# Altium footprint library AltiumDesignerLibraries.PcbLib: 313 footprints (part 1 of 20)
Each footprint in its own frame and in the unit in brackets; x right, y up, seen from the top. Pads: shape width x height; smd on the part's side, far side on the other; paste and mask are expansions set on the pad; w line width, h text height; cw(c..) or ccw(c..) is an arc to the next point about the centre after c.
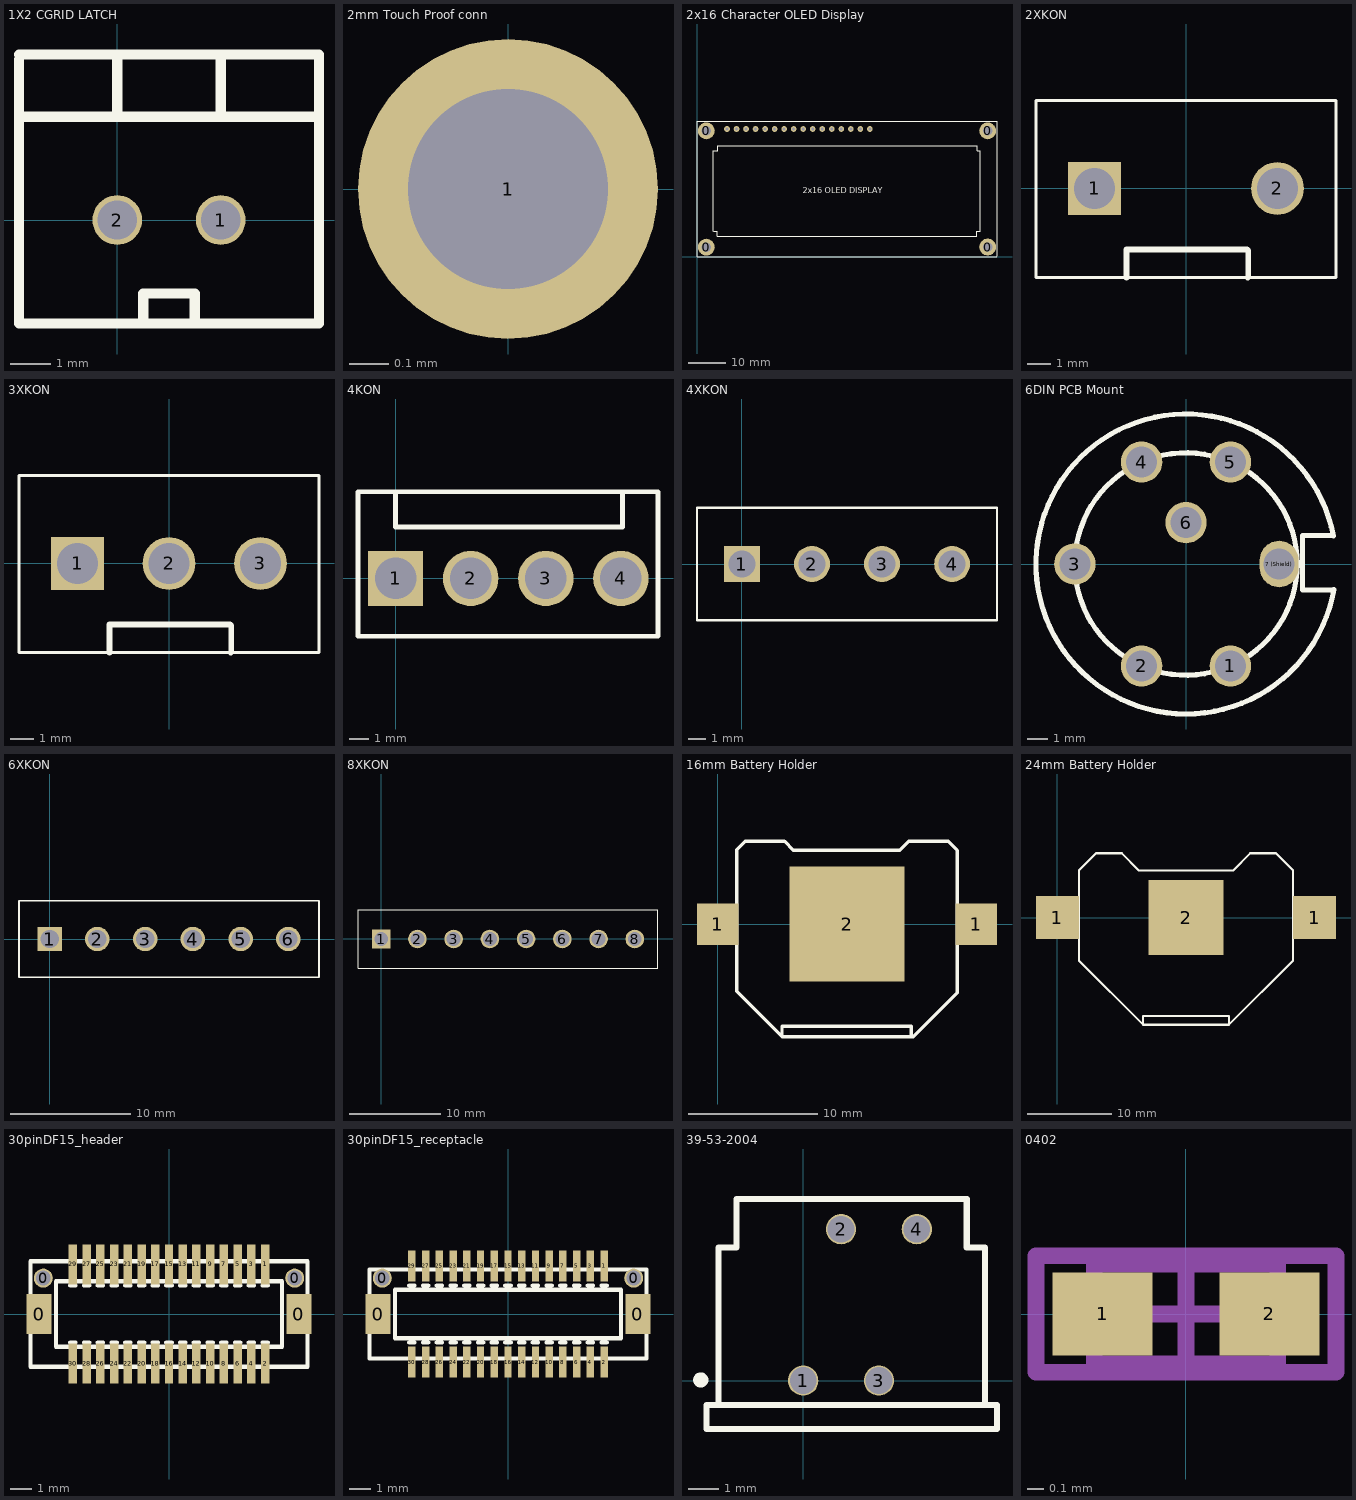
[diagram p0: the footprints below, top view; thin cyan lines are the x and y axes]

## 1X2 CGRID LATCH [mil]
pads (2):
  round 48 hole 38 unplated: 1(100,0) 2(0,0)
Top Overlay:
  lines w10: -95,155 -95,100 -95,-100 195,-100 195,100 ; -95,160 0,160 ; -93,100 195,100 ; 0,100 0,160 ; 25,-100 25,-71 75,-71 75,-100 ; 100,100 100,160 ; 0,160 100,160 ; 100,160 195,160 195,100

## 2mm Touch Proof conn [mil] "2mm Touch Proof conn"
pads (1):
  round 30 hole 20: 1(0,0)

## 2x16 Character OLED Display [mm]
pads (20):
  round 4.5 hole 2.5: 0(2.5,2.5) 0(2.5,33.5) 0(77.5,2.53) 0(77.5,33.5)
  round 1.524 hole 0.762: 1(8,34) 2(10.54,34) 3(13.08,34) 4(15.62,34) 5(18.16,34) 6(20.7,34) 7(23.24,34) 8(25.78,34) 9(28.32,34) 10(30.86,34) 11(33.4,34) 12(35.94,34) 13(38.48,34) 14(41.02,34) 15(43.56,34) 16(46.1,34)
Top Overlay:
  lines w0.254: 4.4,6.67 4.4,28.185 ; 4.409,28.185 5.47,28.185 5.47,29.6 74.685,29.6 74.685,28.185 75.591,28.185 ; 4.461,6.67 5.4,6.67 5.4,5.4 74.615,5.4 74.615,6.67 75.6,6.67 75.6,28.185 ; 79.99,0 0,0 0,36 80,36 80,0.01
  text "2x16 OLED DISPLAY" at 28.194,16.891 h1.52
3D body: height 13.8, standoff 7.4, extent -0.082,-0.001 79.918,35.999
3D body: height 9.56, standoff -3.38, extent 37.21,32.73 47.37,35.27
3D body: height 9.56, standoff -3.38, extent 27.05,32.73 37.21,35.27
3D body: height 9.56, standoff -3.38, extent 16.89,32.73 27.05,35.27
3D body: height 9.56, standoff -3.38, extent 6.73,32.73 16.89,35.27

## 2XKON [mil] "Pins spaced for AC mains connection"
pads (2):
  rect 90x90 hole 70: 1(-156,0)
  round 90 hole 70: 2(156,0)
Top Overlay:
  lines w5: -256,-152 256,-152 256,150 -256,150 -256,-152
  lines w10: -101.38,-152 -101.38,-104.33 104.33,-104.33 106.3,-106.3 106.3,-151.02 105.31,-152

## 3XKON [mil] "0.156\" pin spacing"
pads (3):
  rect 90x90 hole 70: 1(-156,0)
  round 90 hole 70: 2(0,0) 3(156,0)
Top Overlay:
  lines w5: -256,-152 -256,150 256,150 256,-152 -256,-152
  lines w10: -101.38,-152 -101.38,-104.33 104.33,-104.33 106.3,-106.3 106.3,-151.02 105.31,-152

## 4KON [mil]
pads (4):
  rect 115x115 hole 86: 1(0,0)
  round 115 hole 86: 2(156,0) 3(312,0) 4(468,0)
Top Overlay:
  lines w10: 0,107 312,107 ; 0,108 0,180 ; 310,107 471,107 ; 471,110 471,180 ; -78,-120 545,-120 545,180 156,180 -78,180 -78,-120

## 4XKON [mil]
pads (4):
  rect 80x80 hole 60: 1(0.25,0)
  round 80 hole 60: 2(156.25,0) 3(312.25,0) 4(468.25,0)
Top Overlay:
  lines w5: -99.75,-125 568.25,-125 568.25,125 -99.75,125 -99.75,-125

## 6DIN PCB Mount [mil]
pads (7):
  round 80 hole 60: 1(85.73,-197.17) 2(-85.73,-197.17) 3(-215,0) 4(-85.73,197.17) 5(85.73,197.17) 6(0,80)
  oval 75x90 hole 60: "7 (Shield)"(180,0)
Top Overlay:
  circle w10: c0,0 r215
  lines w10: 284.92,54.04 ccw(c0,0) 285.78,-49.27 ; 285,-50 225,-50 225,55 285,55

## 6XKON [mil]
pads (6):
  rect 80x80 hole 60: 1(0.25,0)
  round 80 hole 60: 2(156.25,0) 3(312.25,0) 4(468.25,0) 5(624.25,0) 6(780.25,0)
Top Overlay:
  lines w5: -99.75,-125 -99.75,125 880.25,125 880.25,-125 -99.75,-125

## 8XKON [mil]
pads (8):
  rect 80x80 hole 60: 1(0,-0.25)
  round 80 hole 60: 2(156,-0.25) 3(312,-0.25) 4(468,-0.25) 5(624,-0.25) 6(780,-0.25) 7(936,-0.25) 8(1092,-0.25)
Top Overlay:
  lines w5: -100,-125.25 -100,124.75 1192,124.75 1192,-125.25 -100,-125.25

## 16mm Battery Holder [mm] "3012TR Used with CR1632 battery"
pads (3):
  rect 3.2x3.2 smd: 1(0,0) 1(20,0)
  rect 8.89x8.89 smd: 2(10,0)
Top Overlay:
  lines w0.254: 14.971,-8.7 14.971,-7.898 4.986,-7.898 4.98,-7.892 4.98,-8.7 ; 4.98,-8.7 15.1,-8.7 15.119,-8.7 18.52,-5.299 18.52,5.699 17.819,6.4 14.771,6.4 14.095,5.724 5.849,5.724 5.174,6.398 5.172,6.398 2.124,6.398 1.475,5.749 1.475,-5.199 4.976,-8.7 4.98,-8.7

## 24mm Battery Holder [mm] "3008 Surface mount"
pads (3):
  rect 5.08x5.08 smd: 1(0,0) 1(30.48,0)
  rect 8.89x8.89 smd: 2(15.24,0)
Top Overlay:
  lines w0.254: 10.16,-12.7 20.32,-12.7 ; 10.16,-12.7 2.54,-5.08 2.54,4.572 2.54,5.588 4.572,7.62 7.62,7.62 9.652,5.588 20.828,5.588 22.86,7.62 25.908,7.62 27.94,5.588 27.94,5.08 27.94,-5.08 20.32,-12.7 ; 10.16,-12.7 10.16,-11.684 20.32,-11.684 20.32,-12.7

## 30pinDF15_header [mm] "DF15 series SMT 30pin header"
pads (34):
  rect 1.2x1.9 all layers, no hole: 0(-6.15,0) 0(6.15,0)
  round 0.9 hole 0.7 unplated: 0(-5.95,1.7) 0(5.95,1.7)
  rect 0.4x1.9 smd: 1(4.55,2.35) 2(4.55,-2.35) 3(3.9,2.35) 4(3.9,-2.35) 5(3.25,2.35) 6(3.25,-2.35) 7(2.6,2.35) 8(2.6,-2.35) 9(1.95,2.35) 10(1.95,-2.35) 11(1.3,2.35) 12(1.3,-2.35) 13(0.65,2.35) 14(0.65,-2.35) 15(0,2.35) 16(0,-2.35) 17(-0.65,2.35) 18(-0.65,-2.35) 19(-1.3,2.35) 20(-1.3,-2.35) 21(-1.95,2.35) 22(-1.95,-2.35) 23(-2.6,2.35) 24(-2.6,-2.35) 25(-3.25,2.35) 26(-3.25,-2.35) 27(-3.9,2.35) 28(-3.9,-2.35) 29(-4.55,2.35) 30(-4.55,-2.35)
Top Overlay:
  lines w0.2: -4.675,-1.35 -4.425,-1.35 ; -4.675,1.35 -4.425,1.35 ; -4.025,-1.35 -3.775,-1.35 ; -4.025,1.35 -3.775,1.35 ; -3.375,-1.35 -3.125,-1.35 ; -3.375,1.35 -3.125,1.35 ; -2.725,-1.35 -2.475,-1.35 ; -2.725,1.35 -2.475,1.35 ; -2.075,-1.35 -1.825,-1.35 ; -2.075,1.35 -1.825,1.35 ; -1.425,-1.35 -1.175,-1.35 ; -1.425,1.35 -1.175,1.35 ; -0.775,-1.35 -0.525,-1.35 ; -0.775,1.35 -0.525,1.35 ; -0.125,-1.35 0.125,-1.35 ; -0.125,1.35 0.125,1.35 ; 0.525,-1.35 0.775,-1.35 ; 0.525,1.35 0.775,1.35 ; 1.175,-1.35 1.425,-1.35 ; 1.175,1.35 1.425,1.35 ; 1.825,-1.35 2.075,-1.35 ; 1.825,1.35 2.075,1.35 ; 2.475,-1.35 2.725,-1.35 ; 2.475,1.35 2.725,1.35 ; 3.125,-1.35 3.375,-1.35 ; 3.125,1.35 3.375,1.35 ; 3.775,-1.35 4.025,-1.35 ; 3.775,1.35 4.025,1.35 ; 4.425,-1.35 4.675,-1.35 ; 4.425,1.35 4.675,1.35 ; -6.55,-2.5 6.55,-2.5 6.55,2.5 -6.55,2.5 -6.55,-2.5 ; -5.35,-1.55 5.35,-1.55 5.35,1.55 -5.35,1.55 -5.35,-1.55

## 30pinDF15_receptacle [mm] "DF15 series 30 pin receptacle"
pads (34):
  rect 1.2x1.9 all layers, no hole: 0(-6.15,0) 0(6.15,0)
  round 0.9 hole 0.7 unplated: 0(-5.95,1.7) 0(5.95,1.7)
  rect 0.35x1.45 smd: 1(4.55,2.275) 2(4.55,-2.275) 3(3.9,2.275) 4(3.9,-2.275) 5(3.25,2.275) 6(3.25,-2.275) 7(2.6,2.275) 8(2.6,-2.275) 9(1.95,2.275) 10(1.95,-2.275) 11(1.3,2.275) 12(1.3,-2.275) 13(0.65,2.275) 14(0.65,-2.275) 15(0,2.275) 16(0,-2.275) 17(-0.65,2.275) 18(-0.65,-2.275) 19(-1.3,2.275) 20(-1.3,-2.275) 21(-1.95,2.275) 22(-1.95,-2.275) 23(-2.6,2.275) 24(-2.6,-2.275) 25(-3.25,2.275) 26(-3.25,-2.275) 27(-3.9,2.275) 28(-3.9,-2.275) 29(-4.55,2.275) 30(-4.55,-2.275)
Top Overlay:
  lines w0.2: -4.675,-1.35 -4.425,-1.35 ; -4.675,1.35 -4.425,1.35 ; -4.025,-1.35 -3.775,-1.35 ; -4.025,1.35 -3.775,1.35 ; -3.375,-1.35 -3.125,-1.35 ; -3.375,1.35 -3.125,1.35 ; -2.725,-1.35 -2.475,-1.35 ; -2.725,1.35 -2.475,1.35 ; -2.075,-1.35 -1.825,-1.35 ; -2.075,1.35 -1.825,1.35 ; -1.425,-1.35 -1.175,-1.35 ; -1.425,1.35 -1.175,1.35 ; -0.775,-1.35 -0.525,-1.35 ; -0.775,1.35 -0.525,1.35 ; -0.125,-1.35 0.125,-1.35 ; -0.125,1.35 0.125,1.35 ; 0.525,-1.35 0.775,-1.35 ; 0.525,1.35 0.775,1.35 ; 1.175,-1.35 1.425,-1.35 ; 1.175,1.35 1.425,1.35 ; 1.825,-1.35 2.075,-1.35 ; 1.825,1.35 2.075,1.35 ; 2.475,-1.35 2.725,-1.35 ; 2.475,1.35 2.725,1.35 ; 3.125,-1.35 3.375,-1.35 ; 3.125,1.35 3.375,1.35 ; 3.775,-1.35 4.025,-1.35 ; 3.775,1.35 4.025,1.35 ; 4.425,-1.35 4.675,-1.35 ; 4.425,1.35 4.675,1.35 ; -6.55,-2.1 6.55,-2.1 6.55,2.1 -6.55,2.1 -6.55,-2.1 ; -5.35,-1.15 5.35,-1.15 5.35,1.15 -5.35,1.15 -5.35,-1.15

## 39-53-2004 [mm]
pads (4):
  round 1 hole 0.889: 1(0,0) 2(1.25,5) 3(2.5,0) 4(3.75,5)
Top Overlay:
  circle w0.25: c-3.384,0.022 r0.125
  lines w0.2: -2.8,-0.8 -2.8,1.2 -2.8,4.4 -2.2,4.4 -2.2,6 1.2,6 5.4,6 5.4,4.4 6,4.4 6,1.2 6,-0.8 ; -2.8,-0.8 -3.2,-0.8 -3.2,-1.6 0,-1.6 3.2,-1.6 6.4,-1.6 6.4,-0.8 6,-0.8 ; -2.8,-0.8 6,-0.8

## 0402 [mm] "Chip Capacitor, Body 1.0x0.5mm, IPC High Density"
height 1.3
pads (2):
  rect 0.6x0.5 smd: 1(-0.5,0) 2(0.5,0)
Mechanical 13:
  lines w0.1: -0.55,-0.3 0.55,-0.3 0.55,0.3 -0.55,0.3 -0.55,-0.3
Mechanical 15:
  lines w0.1: -0.3,0 0.3,0 ; 0,-0.3 0,0.3 ; -0.9,-0.35 0.9,-0.35 0.9,0.35 -0.9,0.35 -0.9,-0.35
3D body: height 1.3, standoff 0, extent -0.55,-0.3 0.55,0.3